# Altium footprint library PcbLib.PcbLib: 154 footprints (part 5 of 10)
Each footprint in its own frame and in the unit in brackets; x right, y up, seen from the top. Pads: shape width x height; smd on the part's side, far side on the other; paste and mask are expansions set on the pad; w line width, h text height; cw(c..) or ccw(c..) is an arc to the next point about the centre after c.
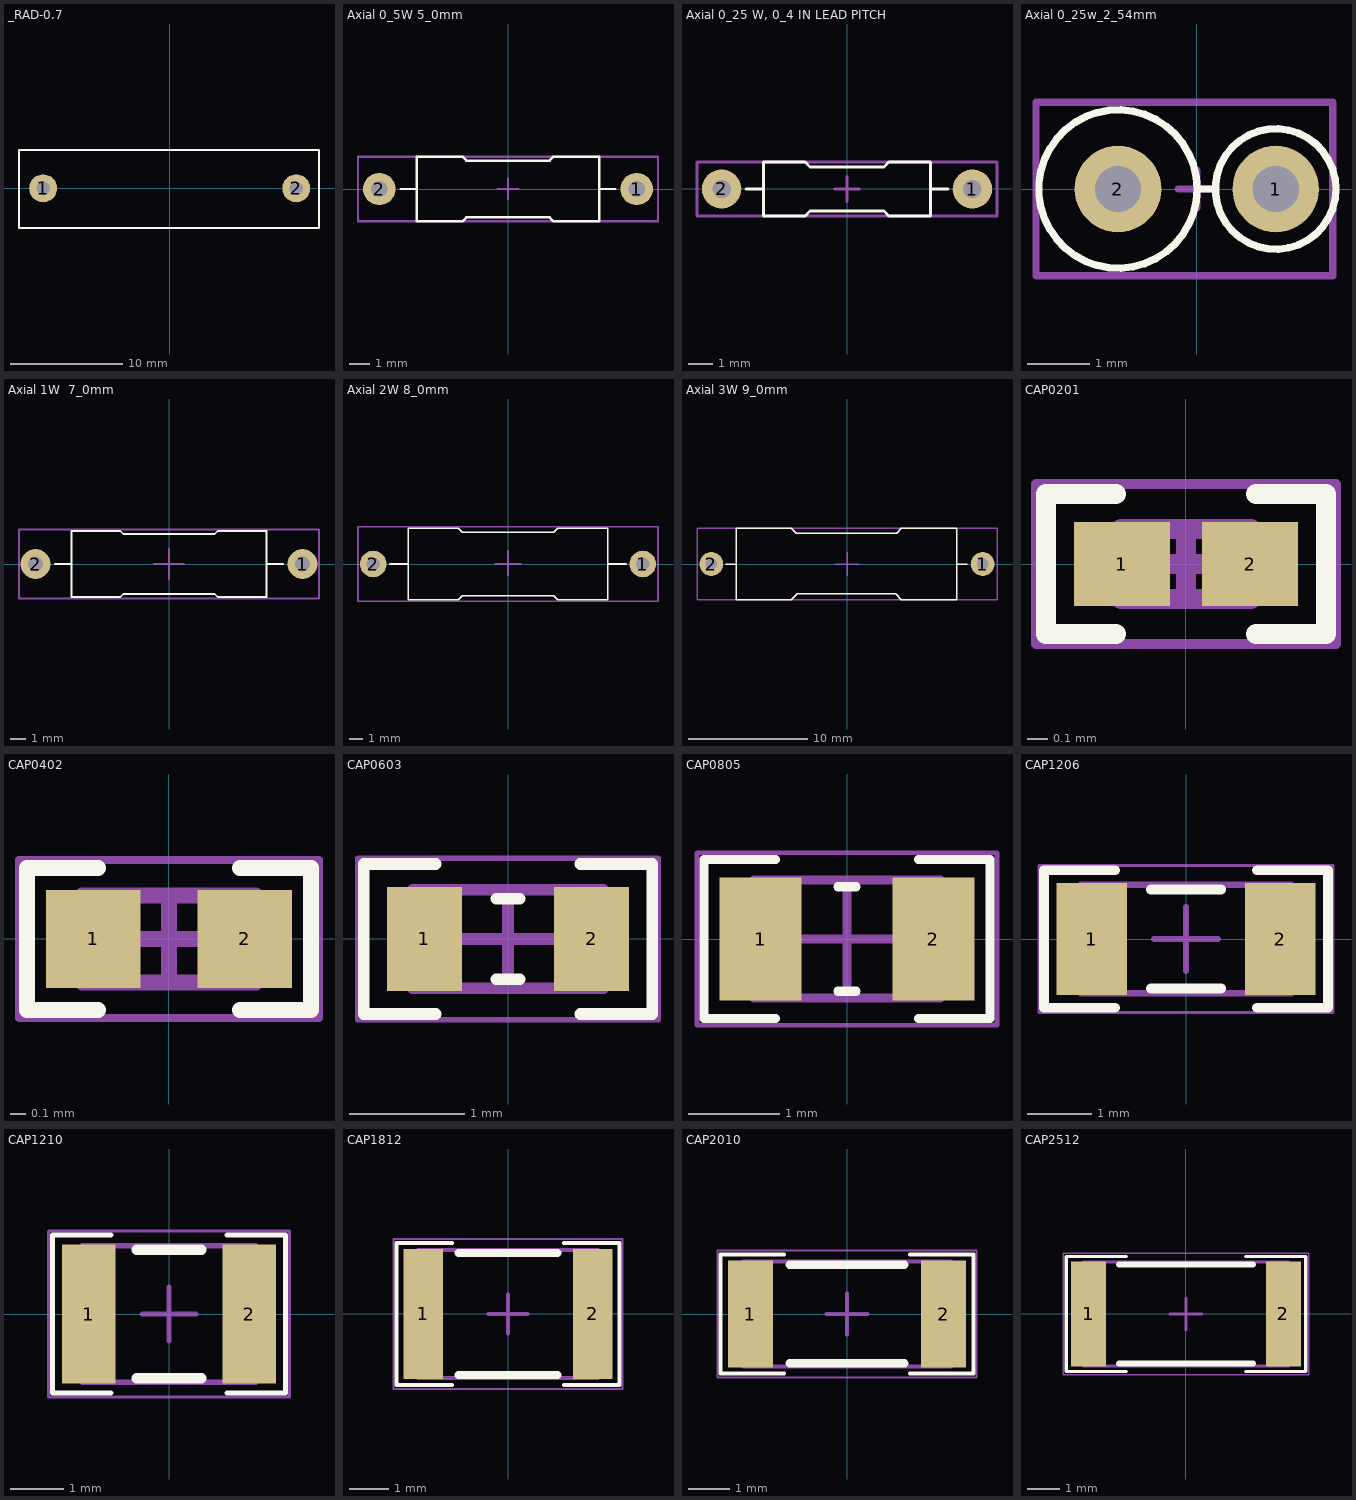
[diagram p4: the footprints below, top view; thin cyan lines are the x and y axes]

## _RAD-0.7 [mm] "22.60mm"
pads (2):
  round 2.5 hole 1.2: 1(-11.303,0) 2(11.303,0)
Top Overlay:
  lines w0.2: -13.462,-3.556 -13.462,3.429 13.335,3.429 13.335,-3.556 -13.462,-3.556

## Axial 0_5W 5_0mm [mm] "Designer Abbas Basereh"
height 6
pads (2):
  round 1.6 hole 0.8: 1(6.35,0) 2(-6.35,0)
Top Overlay:
  lines w0.12: -5.3,0 -4.5,0 ; 4.5,0 5.3,0 ; -4.5,-1.6 -4.5,1.6 -2.25,1.6 -2.05,1.4 2.05,1.4 2.25,1.6 4.5,1.6 4.5,-1.6 2.25,-1.6 2.05,-1.4 -2.05,-1.4 -2.25,-1.6 -4.5,-1.6
Mechanical 15:
  lines w0.12: -0.5,0 0.5,0 ; 0,-0.5 0,0.5 ; -7.4,-1.6 -7.4,1.6 7.4,1.6 7.4,-1.6 -7.4,-1.6
3D body "User Library-Res50 0_5W SilCoat.STEP": height 4.02, standoff -1.3, extent -6.7,-1.65 6.7,1.65

## Axial 0_25 W, 0_4 IN LEAD PITCH [mm] "Designer Abbas Basereh"
height 5
pads (2):
  round 1.6 hole 0.75: 1(5.1,0) 2(-5.1,0)
Top Overlay:
  lines w0.12: -4.1,0 -3.4,0 ; 3.4,0 4.1,0 ; -3.4,-1.1 -1.7,-1.1 -1.5,-0.9 1.5,-0.9 1.7,-1.1 3.4,-1.1 3.4,1.1 1.7,1.1 1.5,0.9 -1.5,0.9 -1.7,1.1 -3.4,1.1 -3.4,-1.1
Mechanical 15:
  lines w0.12: -0.5,0 0.5,0 ; 0,-0.5 0,0.5 ; -6.1,-1.1 6.1,-1.1 6.1,1.1 -6.1,1.1 -6.1,-1.1
3D body "SW3dPS-RESISTOR, 0.25 W, 0.4 IN LEAD PITCH.STEP": height 3.63, standoff -1.84, extent -5.405,-1.156 5.365,1.156

## Axial 0_25w_2_54mm [mm] "Designer Abbas Basereh"
height 7
pads (2):
  round 1.4 hole 0.75: 1(1.275,0) 2(-1.275,0)
Top Overlay:
  circle w0.12: c1.275,0 r0.975
  circle w0.12: c-1.275,0 r1.281
  lines w0.12: 0.006,0 0.3,0
Mechanical 15:
  lines w0.12: -0.3,0 0.3,0 ; 0,-0.3 0,0.3 ; -2.6,-1.4 2.2,-1.4 2.2,1.4 -2.6,1.4 -2.6,-1.4
3D body "User Library-Resistor 0_25w_2_54mm.STEP": height 9.4, standoff -2, extent -2.475,-1.2 1.565,1.2

## Axial 1W  7_0mm [mm] "Designer Abbas Basereh"
height 7
pads (2):
  round 2 hole 1: 1(8.9,0) 2(-8.9,0)
Top Overlay:
  lines w0.12: -7.6,0 -6.5,0 ; 6.5,0 7.6,0 ; -6.5,-2.2 -6.5,2.2 -3.25,2.2 -3.05,2 3.05,2 3.25,2.2 6.5,2.2 6.5,-2.2 3.25,-2.2 3.05,-2 -3.05,-2 -3.25,-2.2 -6.5,-2.2
Mechanical 15:
  lines w0.12: -1,0 1,0 ; 0,-1 0,1 ; -10,-2.3 -10,2.3 10,2.3 10,-2.3 -10,-2.3
3D body "User Library-Res70 1W SilCoat.STEP": height 5.22, standoff -1.3, extent -9.265,-2.25 9.265,2.25

## Axial 2W 8_0mm [mm] "Designer Abbas Basereh"
height 8
pads (2):
  round 2 hole 1: 1(10.15,0) 2(-10.15,0)
Top Overlay:
  lines w0.12: -8.9,0 -7.5,0 ; 7.5,0 8.9,0 ; -7.5,-2.7 -3.75,-2.7 -3.45,-2.4 3.45,-2.4 3.75,-2.7 7.5,-2.7 7.5,2.7 3.75,2.7 3.45,2.4 -3.45,2.4 -3.75,2.7 -7.5,2.7 -7.5,-2.7
Mechanical 15:
  lines w0.12: -1,0 1,0 ; 0,-0.9 0,1 ; -11.3,-2.8 11.3,-2.8 11.3,2.8 -11.3,2.8 -11.3,-2.8
3D body "User Library-Res80 2W SilCoat.STEP": height 5.97, standoff -1.3, extent -10.565,-2.75 10.565,2.75

## Axial 3W 9_0mm [mm] "Designer Abbas Basereh"
height 9
pads (2):
  round 2 hole 1: 1(11.4,0) 2(-11.4,0)
Top Overlay:
  lines w0.12: -10.2,0 -9.3,0 ; 9.2,0 10.1,0 ; -9.3,-3 -9.3,3 -4.675,3 -4.275,2.6 4.175,2.6 4.575,3 9.2,3 9.2,-3 4.575,-3 4.075,-2.5 -4.175,-2.5 -4.675,-3 -9.3,-3
Mechanical 15:
  lines w0.12: -1,0 1,0 ; 0,-1 0,1 ; -12.6,-3 12.6,-3 12.6,3 -12.6,3 -12.6,-3
3D body "User Library-Res90 3W SilCoat.STEP": height 6.73, standoff -1.3, extent -11.835,-3.01 11.835,3.01

## CAP0201 [mm] "Chip Capacitor, 2-Leads, Body 0/60x0/30mm, IPC Medium Density DESIGNER:ABBAS BASEREH"
height 0.23
pads (2):
  rect 0.48x0.42 smd mask+0.04: 1(-0.32,0) 2(0.32,0)
Top Overlay:
  lines w0.1: -0.35,-0.35 -0.7,-0.35 -0.7,0.35 -0.35,0.35 ; 0.35,-0.35 0.7,-0.35 0.7,0.35 0.35,0.35
Mechanical 13:
  lines w0.1: -0.325,-0.175 0.325,-0.175 0.325,0.175 -0.325,0.175 -0.325,-0.175
Mechanical 15:
  lines w0.05: -0.75,-0.4 0.75,-0.4 0.75,0.4 -0.75,0.4 -0.75,-0.4
  lines w0.1: -0.175,0 0.175,0 ; 0,-0.175 0,0.175
3D body "CAP0201.step": height 0.23, standoff 0, extent -0.325,-0.175 0.325,0.175

## CAP0402 [mm] "Chip Capacitor, 2-Leads, Body 1/00x0/50mm, IPC Medium Density DESIGNER:ABBAS BASEREH"
height 0.32
pads (2):
  rect 0.6x0.62 smd mask+0.06: 1(-0.48,0) 2(0.48,0)
Top Overlay:
  lines w0.1: -0.45,-0.45 -0.9,-0.45 -0.9,0.45 -0.45,0.45 ; 0.45,-0.45 0.9,-0.45 0.9,0.45 0.45,0.45
Mechanical 13:
  lines w0.1: -0.55,-0.275 0.55,-0.275 0.55,0.275 -0.55,0.275 -0.55,-0.275
Mechanical 15:
  lines w0.05: -0.95,-0.5 0.95,-0.5 0.95,0.5 -0.95,0.5 -0.95,-0.5
  lines w0.1: -0.275,0 0.275,0 ; 0,-0.275 0,0.275
3D body "CAP0402.step": height 0.32, standoff 0, extent -0.55,-0.275 0.55,0.275

## CAP0603 [mm] "Chip Capacitor, 2-Leads, Body 1/60x0/80mm, IPC Medium Density DESIGNER:ABBAS BASEREH"
height 0.4
pads (2):
  rect 0.65x0.9 smd: 1(-0.725,0) 2(0.725,0)
Top Overlay:
  lines w0.1: -0.625,-0.65 -1.25,-0.65 -1.25,0.65 -0.625,0.65 ; -0.1,-0.35 0.1,-0.35 ; -0.1,0.35 0.1,0.35 ; 0.625,-0.65 1.25,-0.65 1.25,0.65 0.625,0.65
Mechanical 13:
  lines w0.1: -0.825,-0.425 0.825,-0.425 0.825,0.425 -0.825,0.425 -0.825,-0.425
Mechanical 15:
  lines w0.05: -1.3,-0.7 1.3,-0.7 1.3,0.7 -1.3,0.7 -1.3,-0.7
  lines w0.1: -0.425,0 0.425,0 ; 0,-0.425 0,0.425
3D body "CAP0603.step": height 0.4, standoff 0, extent -0.825,-0.425 0.825,0.425

## CAP0805 [mm] "Chip Capacitor, 2-Leads, Body 2/00x1/25mm, IPC Medium Density DESIGNER:ABBAS BASEREH"
height 0.5
pads (2):
  rect 0.9x1.35 smd: 1(-0.95,0) 2(0.95,0)
Top Overlay:
  lines w0.1: -0.788,-0.875 -1.575,-0.875 -1.575,0.875 -0.788,0.875 ; -0.1,-0.575 0.1,-0.575 ; -0.1,0.575 0.1,0.575 ; 0.788,-0.875 1.575,-0.875 1.575,0.875 0.788,0.875
Mechanical 13:
  lines w0.1: -1.025,-0.65 -1.025,0.65 1.025,0.65 1.025,-0.65 -1.025,-0.65
Mechanical 15:
  lines w0.05: -1.65,-0.95 -1.65,0.95 1.65,0.95 1.65,-0.95 -1.65,-0.95
  lines w0.1: -0.5,0 0.5,0 ; 0,-0.5 0,0.5
3D body "CAP0805.step": height 0.5, standoff 0, extent -1.025,-0.65 1.025,0.65

## CAP1206 [mm] "Chip Capacitor, 2-Leads, Body 3/20x1/60mm, IPC Medium Density DESIGNER:ABBAS BASEREH"
height 0.94
pads (2):
  rect 1.1x1.75 smd: 1(-1.475,0) 2(1.475,0)
Top Overlay:
  lines w0.15: -1.112,-1.075 -2.225,-1.075 -2.225,1.075 -1.112,1.075 ; -0.55,-0.775 0.55,-0.775 ; -0.55,0.775 0.55,0.775 ; 1.112,-1.075 2.225,-1.075 2.225,1.075 1.112,1.075
Mechanical 13:
  lines w0.1: -1.65,-0.85 -1.65,0.85 1.65,0.85 1.65,-0.85 -1.65,-0.85
Mechanical 15:
  lines w0.05: -2.3,-1.15 -2.3,1.15 2.3,1.15 2.3,-1.15 -2.3,-1.15
  lines w0.1: -0.5,0 0.5,0 ; 0,-0.5 0,0.5
3D body "CAP1206.step": height 0.94, standoff 0, extent -1.65,-0.85 1.65,0.85

## CAP1210 [mm] "Chip Capacitor, 2-Leads, Body 3/20x2/50mm, IPC Medium Density DESIGNER:ABBAS BASEREH"
height 0.55
pads (2):
  rect 1x2.6 smd: 1(-1.5,0) 2(1.5,0)
Top Overlay:
  lines w0.1: -1.087,-1.475 -2.175,-1.475 -2.175,1.475 -1.087,1.475 ; 1.087,-1.475 2.175,-1.475 2.175,1.475 1.087,1.475
  lines w0.2: -0.6,-1.2 0.6,-1.2 ; -0.6,1.2 0.6,1.2
Mechanical 13:
  lines w0.1: -1.625,-1.275 -1.625,1.275 1.625,1.275 1.625,-1.275 -1.625,-1.275
Mechanical 15:
  lines w0.05: -2.25,-1.55 -2.25,1.55 2.25,1.55 2.25,-1.55 -2.25,-1.55
  lines w0.1: -0.5,0 0.5,0 ; 0,-0.5 0,0.5
3D body "CAP1210.step": height 0.55, standoff 0, extent -1.625,-1.275 1.625,1.275

## CAP1812 [mm] "Chip Capacitor, 2-Leads, Body 4/50x3/20mm, IPC Medium Density DESIGNER:ABBAS BASEREH"
height 0.55
pads (2):
  rect 1x3.3 smd: 1(-2.15,0) 2(2.15,0)
Top Overlay:
  lines w0.1: -1.413,-1.8 -2.825,-1.8 -2.825,1.8 -1.413,1.8 ; 1.413,-1.8 2.825,-1.8 2.825,1.8 1.413,1.8
  lines w0.2: -1.25,-1.55 1.25,-1.55 ; -1.25,1.55 1.25,1.55
Mechanical 13:
  lines w0.1: -2.275,-1.625 2.275,-1.625 2.275,1.625 -2.275,1.625 -2.275,-1.625
Mechanical 15:
  lines w0.05: -2.9,-1.9 2.9,-1.9 2.9,1.9 -2.9,1.9 -2.9,-1.9
  lines w0.1: -0.5,0 0.5,0 ; 0,-0.5 0,0.5
3D body "CAP1812.step": height 0.55, standoff 0, extent -2.275,-1.625 2.275,1.625

## CAP2010 [mm] "Chip Capacitor, 2-Leads, Body 5/00x2/50mm, IPC Medium Density DESIGNER:ABBAS BASEREH"
height 0.55
pads (2):
  rect 1.1x2.6 smd: 1(-2.35,0) 2(2.35,0)
Top Overlay:
  lines w0.1: -1.538,-1.45 -3.075,-1.45 -3.075,1.45 -1.538,1.45 ; 1.538,-1.45 3.075,-1.45 3.075,1.45 1.538,1.45
  lines w0.2: -1.4,-1.2 1.4,-1.2 ; -1.4,1.2 1.4,1.2
Mechanical 13:
  lines w0.1: -2.525,-1.275 2.525,-1.275 2.525,1.275 -2.525,1.275 -2.525,-1.275
Mechanical 15:
  lines w0.05: -3.15,-1.55 3.15,-1.55 3.15,1.55 -3.15,1.55 -3.15,-1.55
  lines w0.1: -0.5,0 0.5,0 ; 0,-0.5 0,0.5
3D body "CAP2010.step": height 0.55, standoff 0, extent -2.525,-1.275 2.525,1.275

## CAP2512 [mm] "Chip Capacitor, 2-Leads, Body 6/40x3/20mm, IPC Medium Density DESIGNER:ABBAS BASEREH"
height 0.7
pads (2):
  rect 1.1x3.3 smd: 1(-3.05,0) 2(3.05,0)
Top Overlay:
  lines w0.1: -1.875,-1.8 -3.75,-1.8 -3.75,1.8 -1.875,1.8 ; 1.875,-1.8 3.75,-1.8 3.75,1.8 1.875,1.8
  lines w0.2: -2.1,-1.55 2.1,-1.55 ; -2.1,1.55 2.1,1.55
Mechanical 13:
  lines w0.1: -3.225,-1.625 -3.225,1.625 3.225,1.625 3.225,-1.625 -3.225,-1.625
Mechanical 15:
  lines w0.05: -3.85,-1.9 -3.85,1.9 3.85,1.9 3.85,-1.9 -3.85,-1.9
  lines w0.1: -0.5,0 0.5,0 ; 0,-0.5 0,0.5
3D body "CAP2512.step": height 0.7, standoff 0, extent -3.225,-1.625 3.225,1.625